# Altium footprint library ic.PcbLib: 114 footprints (part 4 of 8)
Each footprint in its own frame and in the unit in brackets; x right, y up, seen from the top. Pads: shape width x height; smd on the part's side, far side on the other; paste and mask are expansions set on the pad; w line width, h text height; cw(c..) or ccw(c..) is an arc to the next point about the centre after c.
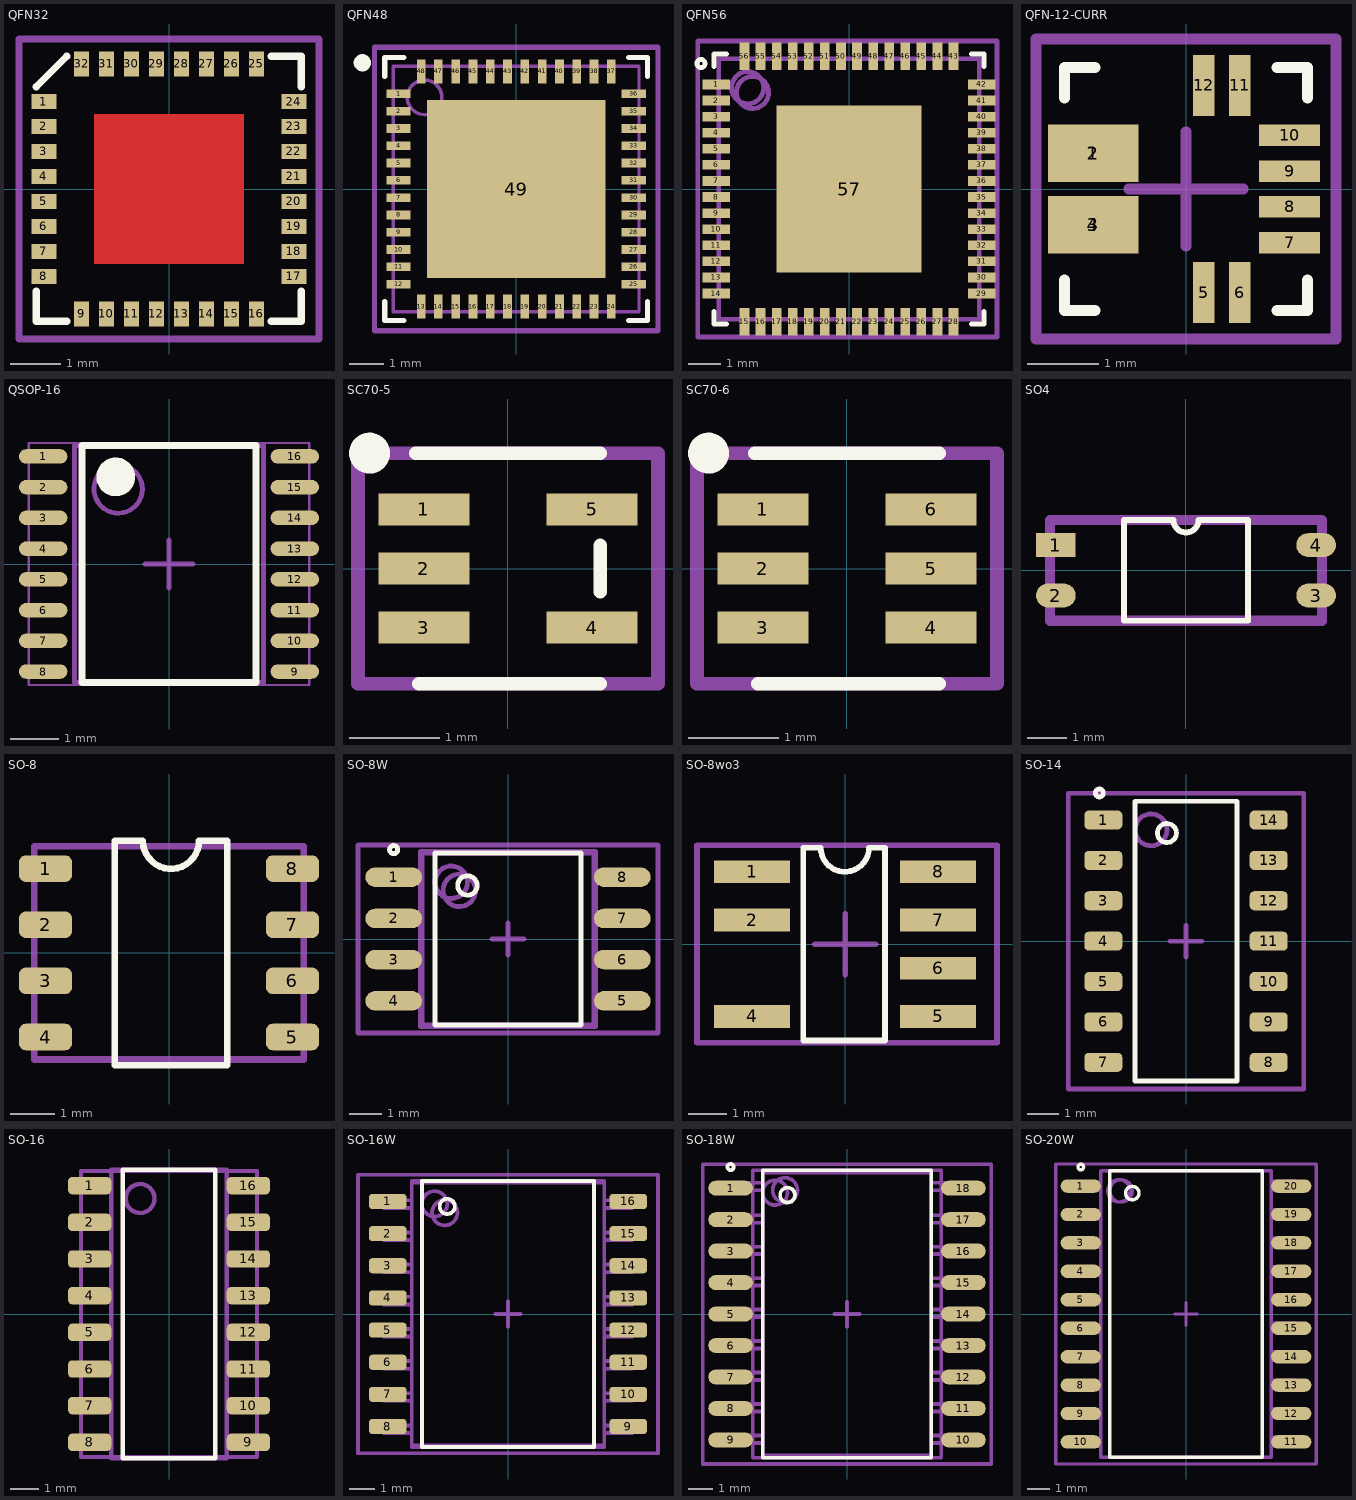
[diagram p3: the footprints below, top view; thin cyan lines are the x and y axes]

## QFN32 [mm]
pads (32):
  rect 0.5x0.3 smd: 1(-2.5,1.75) 2(-2.5,1.25) 3(-2.5,0.75) 4(-2.5,0.25) 5(-2.5,-0.25) 6(-2.5,-0.75) 7(-2.5,-1.25) 8(-2.5,-1.75) 17(2.5,-1.75) 18(2.5,-1.25) 19(2.5,-0.75) 20(2.5,-0.25) 21(2.5,0.25) 22(2.5,0.75) 23(2.5,1.25) 24(2.5,1.75)
  rect 0.3x0.5 smd: 9(-1.75,-2.5) 10(-1.25,-2.5) 11(-0.75,-2.5) 12(-0.25,-2.5) 13(0.25,-2.5) 14(0.75,-2.5) 15(1.25,-2.5) 16(1.75,-2.5) 25(1.75,2.5) 26(1.25,2.5) 27(0.75,2.5) 28(0.25,2.5) 29(-0.25,2.5) 30(-0.75,2.5) 31(-1.25,2.5) 32(-1.75,2.5)
Top Layer:
  rectangle: -1.5,-1.5 1.5,1.5
Top Overlay:
  lines w0.15: -2.65,-2.05 -2.65,-2.65 -2.05,-2.65 ; -2.65,2.05 -2.05,2.65 ; 2.05,-2.65 2.65,-2.65 2.65,-2.05 ; 2.05,2.65 2.65,2.65 2.65,2.05
  text "." at -2.675,2.65 h0.1
Top Courtyard:
  lines w0.15: -0.8,0 0,0 ; 0,-0.8 0,0 ; 0,0.8 0,0 ; 0.8,0 0,0 ; -3,-3 3,-3 3,3 -3,3 -3,-3

## QFN48 [mm] "QFN, 48-Leads, Body 7,00x7,00mm, Pitch 0,50mm, Thermal Pad 5,15x5,15mm, IPC Medium Density"
height 0.75
pads (49):
  rect 0.7x0.25 smd: 1(-3.4,2.75) 2(-3.4,2.25) 3(-3.4,1.75) 4(-3.4,1.25) 5(-3.4,0.75) 6(-3.4,0.25) 7(-3.4,-0.25) 8(-3.4,-0.75) 9(-3.4,-1.25) 10(-3.4,-1.75) 11(-3.4,-2.25) 12(-3.4,-2.75) 25(3.4,-2.75) 26(3.4,-2.25) 27(3.4,-1.75) 28(3.4,-1.25) 29(3.4,-0.75) 30(3.4,-0.25) 31(3.4,0.25) 32(3.4,0.75) 33(3.4,1.25) 34(3.4,1.75) 35(3.4,2.25) 36(3.4,2.75)
  rect 0.25x0.7 smd: 13(-2.75,-3.4) 14(-2.25,-3.4) 15(-1.75,-3.4) 16(-1.25,-3.4) 17(-0.75,-3.4) 18(-0.25,-3.4) 19(0.25,-3.4) 20(0.75,-3.4) 21(1.25,-3.4) 22(1.75,-3.4) 23(2.25,-3.4) 24(2.75,-3.4) 37(2.75,3.4) 38(2.25,3.4) 39(1.75,3.4) 40(1.25,3.4) 41(0.75,3.4) 42(0.25,3.4) 43(-0.25,3.4) 44(-0.75,3.4) 45(-1.25,3.4) 46(-1.75,3.4) 47(-2.25,3.4) 48(-2.75,3.4)
  rect 5.15x5.15 smd: 49(0,0)
Top Overlay:
  circle w0.25: c-4.45,3.65 r0.125
  lines w0.15: -3.8,-3.25 -3.8,-3.8 -3.25,-3.8 ; -3.8,3.25 -3.8,3.8 -3.25,3.8 ; 3.25,-3.8 3.8,-3.8 3.8,-3.25 ; 3.25,3.8 3.8,3.8 3.8,3.25
Top Courtyard:
  lines w0.15: -0.5,0 0.5,0 ; 0,-0.5 0,0.5 ; -4.1,-4.1 4.1,-4.1 4.1,4.1 -4.1,4.1 -4.1,-4.1
Mechanical 13:
  circle w0.1: c-2.65,2.65 r0.5
  lines w0.1: -3.55,-3.55 3.55,-3.55 3.55,3.55 -3.55,3.55 -3.55,-3.55
3D body "QFN48.step": height 0.75, standoff 0, extent -3.6,-3.6 3.6,3.6

## QFN56 [mm] "QFN, 56-Leads, Body 8,00x8,00mm, Pitch 0,50mm, Thermal Pad 4,50x5,20mm, IPC Medium Density"
height 1
pads (57):
  rect 0.85x0.3 smd: 1(-4.125,3.25) 2(-4.125,2.75) 3(-4.125,2.25) 4(-4.125,1.75) 5(-4.125,1.25) 6(-4.125,0.75) 7(-4.125,0.25) 8(-4.125,-0.25) 9(-4.125,-0.75) 10(-4.125,-1.25) 11(-4.125,-1.75) 12(-4.125,-2.25) 13(-4.125,-2.75) 14(-4.125,-3.25) 29(4.125,-3.25) 30(4.125,-2.75) 31(4.125,-2.25) 32(4.125,-1.75) 33(4.125,-1.25) 34(4.125,-0.75) 35(4.125,-0.25) 36(4.125,0.25) 37(4.125,0.75) 38(4.125,1.25) 39(4.125,1.75) 40(4.125,2.25) 41(4.125,2.75) 42(4.125,3.25)
  rect 0.3x0.85 smd: 15(-3.25,-4.125) 16(-2.75,-4.125) 17(-2.25,-4.125) 18(-1.75,-4.125) 19(-1.25,-4.125) 20(-0.75,-4.125) 21(-0.25,-4.125) 22(0.25,-4.125) 23(0.75,-4.125) 24(1.25,-4.125) 25(1.75,-4.125) 26(2.25,-4.125) 27(2.75,-4.125) 28(3.25,-4.125) 43(3.25,4.125) 44(2.75,4.125) 45(2.25,4.125) 46(1.75,4.125) 47(1.25,4.125) 48(0.75,4.125) 49(0.25,4.125) 50(-0.25,4.125) 51(-0.75,4.125) 52(-1.25,4.125) 53(-1.75,4.125) 54(-2.25,4.125) 55(-2.75,4.125) 56(-3.25,4.125)
  rect 4.5x5.2 smd: 57(0,0)
Top Overlay:
  circle w0.15: c-4.6,3.9 r0.125
  lines w0.15: -4.2,-3.8 -4.2,-4.2 -3.8,-4.2 ; -4.2,3.8 -4.2,4.2 -3.8,4.2 ; 3.8,-4.2 4.2,-4.2 4.2,-3.8 ; 3.8,4.2 4.2,4.2 4.2,3.8
Top Courtyard:
  lines w0.15: -0.5,0 0.5,0 ; -4.7,-4.6 4.6,-4.6 4.6,4.6 -4.7,4.6 -4.7,-4.6
Mechanical 13:
  circle w0.15: c-3.15,3.15 r0.5
Mechanical 29:
  circle w0.15: c-3,3 r0.5
  lines w0.15: -4.05,-4.05 4.05,-4.05 4.05,4.05 -4.05,4.05 -4.05,-4.05
  text ".Designator" at -3.5,-0.4 h1

## QFN-12-CURR [mm] "QFN, 12-Contact  With Fused Sensed Current Loop"
height 0.9
pads (12):
  rect 1.27x0.8 smd: 1(-1.3,0.5) 2(-1.3,0.5) 3(-1.3,-0.5) 4(-1.3,-0.5)
  rect 0.3x0.85 smd: 5(0.25,-1.45) 6(0.75,-1.45) 11(0.75,1.45) 12(0.25,1.45)
  rect 0.85x0.3 smd: 7(1.45,-0.75) 8(1.45,-0.25) 9(1.45,0.25) 10(1.45,0.75)
Top Overlay:
  lines w0.15: -1.7,-1.275 -1.7,-1.7 -1.275,-1.7 ; -1.7,1.275 -1.7,1.7 -1.275,1.7 ; 1.275,-1.7 1.7,-1.7 1.7,-1.275 ; 1.275,1.7 1.7,1.7 1.7,1.275
  text "." at -2.2,1.575 h0.1
Top Courtyard:
  lines w0.15: -0.8,0 0,0 ; 0,-0.8 0,0 ; 0,0.8 0,0 ; 0.8,0 0,0 ; -2.1,-2.1 2.1,-2.1 2.1,2.1 -2.1,2.1 -2.1,-2.1
3D body "QFN16.STEP": height 0.89, standoff 0, extent -1.55,-1.55 1.55,1.55

## QSOP-16 [mm] "QSOP, 16-Leads, Body 4,89x3,90mm, Pitch 0,64mm, IPC High Density"
height 1.75
pads (16):
  oval 1x0.3 smd: 1(-2.6,2.222) 2(-2.6,1.587) 3(-2.6,0.953) 4(-2.6,0.318) 5(-2.6,-0.318) 6(-2.6,-0.953) 7(-2.6,-1.587) 8(-2.6,-2.222) 9(2.6,-2.222) 10(2.6,-1.587) 11(2.6,-0.953) 12(2.6,-0.318) 13(2.6,0.318) 14(2.6,0.953) 15(2.6,1.587) 16(2.6,2.222)
Top Overlay:
  circle w0.4: c-1.1,1.8 r0.2
  lines w0.15: -1.8,-2.45 1.8,-2.45 1.8,2.45 -1.8,2.45 -1.8,-2.45
  text "." at -2.655,2.859 h0.1
Top Courtyard:
  lines w0.05: -2.9,-2.5 2.9,-2.5 2.9,2.5 -2.9,2.5 -2.9,-2.5
  lines w0.1: -0.5,0 0.5,0 ; 0,-0.5 0,0.5
Mechanical 13:
  circle w0.1: c-1.05,1.55 r0.5
  lines w0.1: -1.95,-2.45 1.95,-2.45 1.95,2.45 -1.95,2.45 -1.95,-2.45
3D body: height 1.75, standoff 0.2, extent 0,0 0,0
3D body: height 1, standoff 0.2, extent -2,-2.5 2,2.5

## SC70-5 [mm] "SOTFL, 5-Leads, Body 2,00x2,10mm, Pitch 1,30mm, IPC Medium Density"
height 1.1
pads (5):
  rect 1x0.35 smd: 1(-0.925,0.65) 2(-0.925,0) 3(-0.925,-0.65) 4(0.925,-0.65) 5(0.925,0.65)
Top Overlay:
  circle w0.25: c-1.524,1.27 r0.1
  lines w0.15: -1.016,1.27 1.016,1.27 ; -0.984,-1.27 1.016,-1.27 ; 1.016,-0.254 1.016,0.254
Top Courtyard:
  lines w0.15: -1.651,-1.27 -1.651,1.27 1.651,1.27 1.651,-1.27 -1.651,-1.27
3D body: height 1.1, standoff 0, extent -1,-1.143 1,1.143

## SC70-6 [mm] "SOTFL, 6-Leads, Body 2,00x2,10mm, Pitch 1,30mm, IPC Medium Density"
height 1.1
pads (6):
  rect 1x0.35 smd: 1(-0.925,0.65) 2(-0.925,0) 3(-0.925,-0.65) 4(0.925,-0.65) 5(0.925,0) 6(0.925,0.65)
Top Overlay:
  circle w0.25: c-1.524,1.27 r0.1
  lines w0.15: -1.016,1.27 1.016,1.27 ; -0.984,-1.27 1.016,-1.27
Top Courtyard:
  lines w0.15: -1.651,-1.27 1.651,-1.27 1.651,1.27 -1.651,1.27 -1.651,-1.27
3D body: height 1.1, standoff 0, extent -1,-1.143 1,1.143

## SO4 [mm]
pads (4):
  rect 1x0.6 smd: 1(-3.277,0.635)
  oval 1x0.6 smd: 2(-3.277,-0.635) 3(3.277,-0.635) 4(3.277,0.635)
Top Overlay:
  lines w0.15: -1.565,-1.27 1.565,-1.27 1.565,1.27 0.318,1.27 cw(c0,1.27) -0.318,1.27 -1.565,1.27 -1.565,-1.27
  text "." at -3.15,1.435 h0.1
Top Courtyard:
  lines w0.254: -3.429,-1.27 -3.429,1.27 3.429,1.27 3.429,-1.27 -3.429,-1.27
3D body "PC3H7.STEP": height 2.1, standoff 0.05, extent -3.5,-1.3 3.5,1.3

## SO-8 [mm]
pads (8):
  rrect50% 1.2x0.6 smd: 1(-2.794,1.905) 2(-2.794,0.635) 3(-2.794,-0.635) 4(-2.794,-1.905) 5(2.794,-1.905) 6(2.794,-0.635) 7(2.794,0.635) 8(2.794,1.905)
Top Overlay:
  lines w0.15: -1.226,-2.545 1.314,-2.545 1.314,2.535 0.679,2.535 cw(c0.044,2.535) -0.591,2.535 -1.226,2.535 -1.226,-2.545
  text "." at -2.7,2.8 h0.1
Top Courtyard:
  lines w0.15: -3.048,-2.413 3.048,-2.413 3.048,2.413 -3.048,2.413 -3.048,-2.413
3D body "User Library-so8-4.STEP": height 1.76, standoff 0, extent -3.068,-2.445 3.068,2.445

## SO-8W [mm] "SOIC, 8-Leads, Body 5,28x5,28mm, Pitch 1,27mm, IPC Medium Density"
height 1.91
pads (8):
  oval 1.75x0.6 smd: 1(-3.525,1.905) 2(-3.525,0.635) 3(-3.525,-0.635) 4(-3.525,-1.905) 5(3.525,-1.905) 6(3.525,-0.635) 7(3.525,0.635) 8(3.525,1.905)
Top Overlay:
  circle w0.15: c-1.25,1.65 r0.3
  circle w0.15: c-3.525,2.755 r0.125
  lines w0.15: -2.25,-2.65 2.25,-2.65 2.25,2.65 -2.25,2.65 -2.25,-2.65
Top Courtyard:
  lines w0.15: -0.5,0 0.5,0 ; 0,-0.5 0,0.5 ; -4.625,-2.9 4.625,-2.9 4.625,2.9 -4.625,2.9 -4.625,-2.9
Mechanical 13:
  circle w0.15: c-1.75,1.75 r0.5
  lines w0.15: -2.65,-2.65 2.65,-2.65 2.65,2.65 -2.65,2.65 -2.65,-2.65
Mechanical 29:
  circle w0.15: c-1.5,1.5 r0.5
  lines w0.15: -2.7,-2.1 -3.8,-2.1 -3.8,-1.8 -2.7,-1.8 ; -2.7,-0.8 -3.8,-0.8 -3.8,-0.5 -2.7,-0.5 ; -2.7,0.5 -3.8,0.5 -3.8,0.8 -2.7,0.8 ; -2.7,1.8 -3.8,1.8 -3.8,2.1 -2.7,2.1 ; 2.7,-2.1 3.8,-2.1 3.8,-1.8 2.7,-1.8 ; 2.7,-0.8 3.8,-0.8 3.8,-0.5 2.7,-0.5 ; 2.7,0.5 3.8,0.5 3.8,0.8 2.7,0.8 ; 2.7,1.8 3.8,1.8 3.8,2.1 2.7,2.1 ; -2.7,-2.7 -2.7,2.7 2.7,2.7 2.7,-2.7 -2.7,-2.7
  text ".Designator" at -2.5,-0.5 h1
3D body: height 1.91, standoff 0.1, extent -2.65,-2.65 2.65,2.65

## SO-8wo3 [mm]
pads (7):
  rect 2x0.6 smd: 1(-2.45,1.905) 2(-2.45,0.635) 4(-2.45,-1.905) 5(2.45,-1.905) 6(2.45,-0.635) 7(2.45,0.635) 8(2.45,1.905)
Top Overlay:
  lines w0.15: -1.1,-2.54 -1.1,2.54 -0.641,2.54 ccw(c-0.006,2.54) 0.629,2.54 1.05,2.54 1.05,-2.54 -1.1,-2.54
  text "." at -2.5,2.6 h0.1
Top Courtyard:
  lines w0.15: -0.8,0 0,0 ; 0,-0.8 0,0 ; 0,0.8 0,0 ; 0.8,0 0,0 ; -3.9,-2.6 4,-2.6 4,2.6 -3.9,2.6 -3.9,-2.6
3D body "User Library-so8-4.STEP": height 1.76, standoff 0, extent -3.099,-2.445 3.038,2.445

## SO-14 [mm] "SOIC, 14-Leads, Body 8,65x3,90mm, Pitch 1,27mm, IPC Medium Density"
height 1.75
pads (14):
  rrect50% 1.2x0.6 smd: 1(-2.6,3.81) 2(-2.6,2.54) 3(-2.6,1.27) 4(-2.6,0) 5(-2.6,-1.27) 6(-2.6,-2.54) 7(-2.6,-3.81) 8(2.6,-3.81) 9(2.6,-2.54) 10(2.6,-1.27) 11(2.6,0) 12(2.6,1.27) 13(2.6,2.54) 14(2.6,3.81)
Top Overlay:
  circle w0.15: c-0.6,3.4 r0.3
  circle w0.15: c-2.725,4.66 r0.125
  lines w0.15: -1.6,-4.4 1.6,-4.4 1.6,4.4 -1.6,4.4 -1.6,-4.4
Top Courtyard:
  lines w0.15: -0.5,0 0.5,0 ; 0,-0.5 0,0.5 ; -3.7,-4.65 3.7,-4.65 3.7,4.65 -3.7,4.65 -3.7,-4.65
Mechanical 13:
  circle w0.15: c-1.1,3.5 r0.5
3D body "SO-14N.step": height 1.75, standoff 0, extent -3,-4.4 3,4.4

## SO-16 [mm] "SOIC, 16-Leads, Body 9,90x3,90mm, Pitch 1,27mm, IPC Medium Density"
height 1.26
pads (16):
  rrect50% 1.5x0.6 smd: 1(-2.75,4.445) 2(-2.75,3.175) 3(-2.75,1.905) 4(-2.75,0.635) 5(-2.75,-0.635) 6(-2.75,-1.905) 7(-2.75,-3.175) 8(-2.75,-4.445) 9(2.75,-4.445) 10(2.75,-3.175) 11(2.75,-1.905) 12(2.75,-0.635) 13(2.75,0.635) 14(2.75,1.905) 15(2.75,3.175) 16(2.75,4.445)
Top Overlay:
  lines w0.15: -1.6,-5 1.6,-5 1.6,5 -1.6,5 -1.6,-5
  text "." at -3.2,5.3 h0.1
Top Courtyard:
  lines w0.15: -3.048,-4.953 3.048,-4.953 3.048,4.953 -3.048,4.953 -3.048,-4.953
Mechanical 29:
  circle w0.15: c-1,4 r0.5
  lines w0.15: -2,-4.6 -3.1,-4.6 -3.1,-4.3 -2,-4.3 ; -2,-3.33 -3.1,-3.33 -3.1,-3.03 -2,-3.03 ; -2,-2.06 -3.1,-2.06 -3.1,-1.76 -2,-1.76 ; -2,-0.79 -3.1,-0.79 -3.1,-0.49 -2,-0.49 ; -2,0.48 -3.1,0.48 -3.1,0.78 -2,0.78 ; -2,1.75 -3.1,1.75 -3.1,2.05 -2,2.05 ; -2,3.02 -3.1,3.02 -3.1,3.32 -2,3.32 ; -2,4.29 -3.1,4.29 -3.1,4.59 -2,4.59 ; 2,-4.6 3.1,-4.6 3.1,-4.3 2,-4.3 ; 2,-3.33 3.1,-3.33 3.1,-3.03 2,-3.03 ; 2,-2.06 3.1,-2.06 3.1,-1.76 2,-1.76 ; 2,-0.79 3.1,-0.79 3.1,-0.49 2,-0.49 ; 2,0.48 3.1,0.48 3.1,0.78 2,0.78 ; 2,1.75 3.1,1.75 3.1,2.05 2,2.05 ; 2,3.02 3.1,3.02 3.1,3.32 2,3.32 ; 2,4.29 3.1,4.29 3.1,4.59 2,4.59 ; -2,-5 2,-5 2,5 -2,5 -2,-5
  text ".Designator" at -1.9,-0.3 h1
3D body "SO-16.step": height 1.75, standoff 0, extent -3,-5 3,5

## SO-16W [mm] "SOIC, 16-Leads, Body 10,30x7,50mm, Pitch 1,27mm, IPC Medium Density"
height 2.65
pads (16):
  rrect50% 1.5x0.6 smd: 1(-4.75,4.445) 2(-4.75,3.175) 3(-4.75,1.905) 4(-4.75,0.635) 5(-4.75,-0.635) 6(-4.75,-1.905) 7(-4.75,-3.175) 8(-4.75,-4.445) 9(4.75,-4.445) 10(4.75,-3.175) 11(4.75,-1.905) 12(4.75,-0.635) 13(4.75,0.635) 14(4.75,1.905) 15(4.75,3.175) 16(4.75,4.445)
Top Overlay:
  circle w0.15: c-2.4,4.25 r0.3
  lines w0.15: -3.4,-5.25 -3.4,5.25 3.4,5.25 3.4,-5.25 -3.4,-5.25
  text "." at -5.5,5.4 h0.1
Top Courtyard:
  lines w0.15: -0.5,0 0.5,0 ; 0,-0.5 0,0.5 ; -5.925,-5.5 -5.925,5.5 5.925,5.5 5.925,-5.5 -5.925,-5.5
Mechanical 13:
  circle w0.15: c-2.9,4.35 r0.5
  lines w0.15: -3.8,-5.25 -3.8,5.25 3.8,5.25 3.8,-5.25 -3.8,-5.25
Mechanical 29:
  circle w0.15: c-2.5,4 r0.5
  lines w0.15: -3.8,-4.7 -4.9,-4.7 -4.9,-4.4 -3.8,-4.4 ; -3.8,-3.43 -4.9,-3.43 -4.9,-3.13 -3.8,-3.13 ; -3.8,-2.16 -4.9,-2.16 -4.9,-1.86 -3.8,-1.86 ; -3.8,-0.89 -4.9,-0.89 -4.9,-0.59 -3.8,-0.59 ; -3.8,0.38 -4.9,0.38 -4.9,0.68 -3.8,0.68 ; -3.8,1.65 -4.9,1.65 -4.9,1.95 -3.8,1.95 ; -3.8,2.92 -4.9,2.92 -4.9,3.22 -3.8,3.22 ; -3.8,4.19 -4.9,4.19 -4.9,4.49 -3.8,4.49 ; 3.8,-4.7 4.9,-4.7 4.9,-4.4 3.8,-4.4 ; 3.8,-3.43 4.9,-3.43 4.9,-3.13 3.8,-3.13 ; 3.8,-2.16 4.9,-2.16 4.9,-1.86 3.8,-1.86 ; 3.8,-0.89 4.9,-0.89 4.9,-0.59 3.8,-0.59 ; 3.8,0.38 4.9,0.38 4.9,0.68 3.8,0.68 ; 3.8,1.65 4.9,1.65 4.9,1.95 3.8,1.95 ; 3.8,2.92 4.9,2.92 4.9,3.22 3.8,3.22 ; 3.8,4.19 4.9,4.19 4.9,4.49 3.8,4.49 ; -3.8,-5.2 3.8,-5.2 3.8,5.2 -3.8,5.2 -3.8,-5.2
  text ".Designator" at -3.3,-0.3 h1
3D body "SOIC16W.step": height 2.65, standoff 0, extent -5.162,-5.25 5.162,5.25

## SO-18W [mm] "JEDEC MS-013"
height 2.57
pads (18):
  oval 1.8x0.6 smd: 1(-4.7,5.08) 2(-4.7,3.81) 3(-4.7,2.54) 4(-4.7,1.27) 5(-4.7,0) 6(-4.7,-1.27) 7(-4.7,-2.54) 8(-4.7,-3.81) 9(-4.7,-5.08) 10(4.7,-5.08) 11(4.7,-3.81) 12(4.7,-2.54) 13(4.7,-1.27) 14(4.7,0) 15(4.7,1.27) 16(4.7,2.54) 17(4.7,3.81) 18(4.7,5.08)
Top Overlay:
  circle w0.15: c-2.4,4.8 r0.3
  circle w0.15: c-4.7,5.93 r0.125
  lines w0.15: -3.4,-5.8 3.4,-5.8 3.4,5.8 -3.4,5.8 -3.4,-5.8
Top Courtyard:
  lines w0.15: -0.5,0 0.5,0 ; 0,-0.5 0,0.5 ; -5.825,-6.05 5.825,-6.05 5.825,6.05 -5.825,6.05 -5.825,-6.05
Mechanical 13:
  circle w0.15: c-2.9,4.9 r0.5
  lines w0.15: -3.8,-5.8 3.8,-5.8 3.8,5.8 -3.8,5.8 -3.8,-5.8
Mechanical 29:
  circle w0.15: c-2.5,5 r0.5
  lines w0.15: -3.4,-5.2 -4.5,-5.2 -4.5,-4.9 -3.4,-4.9 ; -3.4,-3.93 -4.5,-3.93 -4.5,-3.63 -3.4,-3.63 ; -3.4,-2.66 -4.5,-2.66 -4.5,-2.36 -3.4,-2.36 ; -3.4,-1.39 -4.5,-1.39 -4.5,-1.09 -3.4,-1.09 ; -3.4,-0.12 -4.5,-0.12 -4.5,0.18 -3.4,0.18 ; -3.4,1.15 -4.5,1.15 -4.5,1.45 -3.4,1.45 ; -3.4,2.42 -4.5,2.42 -4.5,2.72 -3.4,2.72 ; -3.4,3.69 -4.5,3.69 -4.5,3.99 -3.4,3.99 ; -3.4,5 -4.5,5 -4.5,5.3 -3.4,5.3 ; 3.4,-5.2 4.5,-5.2 4.5,-4.9 3.4,-4.9 ; 3.4,-3.93 4.5,-3.93 4.5,-3.63 3.4,-3.63 ; 3.4,-2.66 4.5,-2.66 4.5,-2.36 3.4,-2.36 ; 3.4,-1.39 4.5,-1.39 4.5,-1.09 3.4,-1.09 ; 3.4,-0.12 4.5,-0.12 4.5,0.18 3.4,0.18 ; 3.4,1.15 4.5,1.15 4.5,1.45 3.4,1.45 ; 3.4,2.42 4.5,2.42 4.5,2.72 3.4,2.72 ; 3.4,3.69 4.5,3.69 4.5,3.99 3.4,3.99 ; 3.4,5 4.5,5 4.5,5.3 3.4,5.3 ; -3.4,-5.7 3.4,-5.7 3.4,5.7 -3.4,5.7 -3.4,-5.7
  text ".Designator" at -3.1,-0.4 h1
3D body: height 2.57, standoff 0.23, extent -3.8,-5.8 3.8,5.8

## SO-20W [mm] "JEDEC MS-013"
height 2.57
pads (20):
  oval 1.8x0.6 smd: 1(-4.7,5.715) 2(-4.7,4.445) 3(-4.7,3.175) 4(-4.7,1.905) 5(-4.7,0.635) 6(-4.7,-0.635) 7(-4.7,-1.905) 8(-4.7,-3.175) 9(-4.7,-4.445) 10(-4.7,-5.715) 11(4.7,-5.715) 12(4.7,-4.445) 13(4.7,-3.175) 14(4.7,-1.905) 15(4.7,-0.635) 16(4.7,0.635) 17(4.7,1.905) 18(4.7,3.175) 19(4.7,4.445) 20(4.7,5.715)
Top Overlay:
  circle w0.15: c-4.7,6.565 r0.125
  circle w0.15: c-2.4,5.4 r0.3
  lines w0.15: -3.4,-6.4 -3.4,6.4 3.4,6.4 3.4,-6.4 -3.4,-6.4
Top Courtyard:
  lines w0.15: -0.5,0 0.5,0 ; 0,-0.5 0,0.5 ; -5.825,-6.7 -5.825,6.7 5.825,6.7 5.825,-6.7 -5.825,-6.7
Mechanical 13:
  circle w0.15: c-2.9,5.5 r0.5
  lines w0.15: -3.8,-6.4 -3.8,6.4 3.8,6.4 3.8,-6.4 -3.8,-6.4
Mechanical 29:
  circle w0.15: c-3,5.5 r0.5
  lines w0.15: -3.8,-5.9 -4.9,-5.9 -4.9,-5.6 -3.8,-5.6 ; -3.8,-4.63 -4.9,-4.63 -4.9,-4.33 -3.8,-4.33 ; -3.8,-3.36 -4.9,-3.36 -4.9,-3.06 -3.8,-3.06 ; -3.8,-2.09 -4.9,-2.09 -4.9,-1.79 -3.8,-1.79 ; -3.8,-0.82 -4.9,-0.82 -4.9,-0.52 -3.8,-0.52 ; -3.8,0.45 -4.9,0.45 -4.9,0.75 -3.8,0.75 ; -3.8,1.72 -4.9,1.72 -4.9,2.02 -3.8,2.02 ; -3.8,2.99 -4.9,2.99 -4.9,3.29 -3.8,3.29 ; -3.8,4.26 -4.9,4.26 -4.9,4.56 -3.8,4.56 ; -3.8,5.53 -4.9,5.53 -4.9,5.83 -3.8,5.83 ; 3.8,-5.8 4.9,-5.8 4.9,-5.5 3.8,-5.5 ; 3.8,-4.53 4.9,-4.53 4.9,-4.23 3.8,-4.23 ; 3.8,-3.26 4.9,-3.26 4.9,-2.96 3.8,-2.96 ; 3.8,-1.99 4.9,-1.99 4.9,-1.69 3.8,-1.69 ; 3.8,-0.72 4.9,-0.72 4.9,-0.42 3.8,-0.42 ; 3.8,0.55 4.9,0.55 4.9,0.85 3.8,0.85 ; 3.8,1.82 4.9,1.82 4.9,2.12 3.8,2.12 ; 3.8,3.09 4.9,3.09 4.9,3.39 3.8,3.39 ; 3.8,4.36 4.9,4.36 4.9,4.66 3.8,4.66 ; 3.8,5.63 4.9,5.63 4.9,5.93 3.8,5.93 ; -3.8,-6.4 -3.8,6.4 3.8,6.4 3.8,-6.4 -3.8,-6.4
  text ".Designator" at -3.1,-0.3 h1
3D body: height 2.57, standoff 0.23, extent -3.8,-6.4 3.8,6.4